# Altium footprint library Gate Driver Board.PcbLib: 123 footprints (part 8 of 8)
Each footprint in its own frame and in the unit in brackets; x right, y up, seen from the top. Pads: shape width x height; smd on the part's side, far side on the other; paste and mask are expansions set on the pad; w line width, h text height; cw(c..) or ccw(c..) is an arc to the next point about the centre after c.
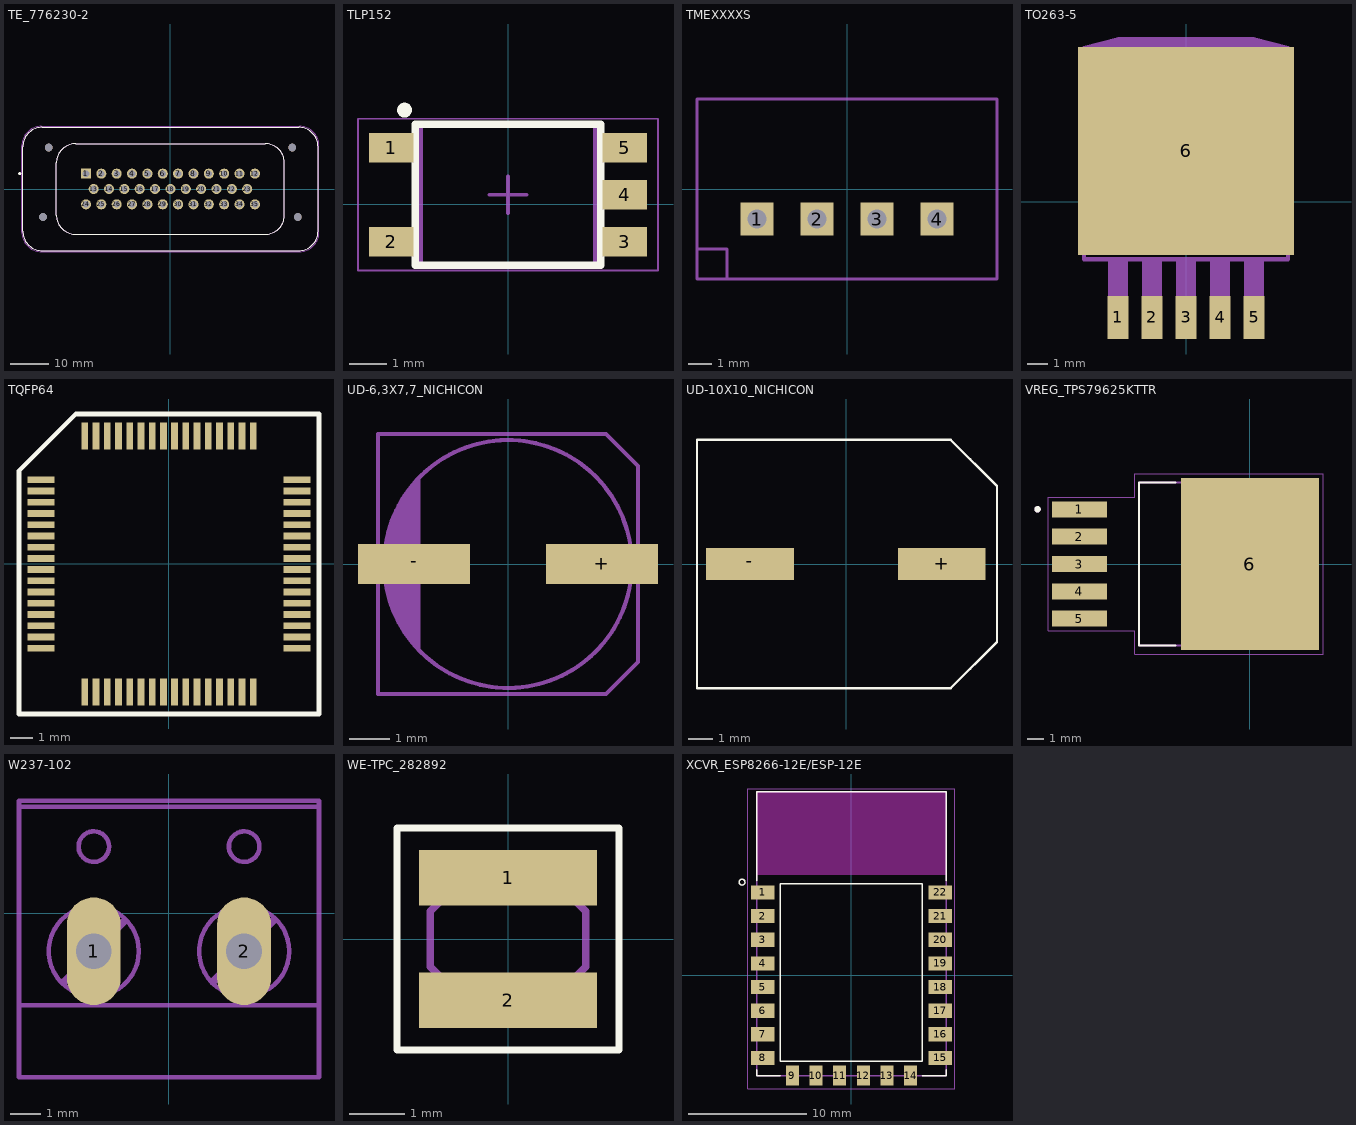
[diagram p7: the footprints below, top view; thin cyan lines are the x and y axes]

## TE_776230-2 [mm]
pads (39):
  rect 2.625x2.625 hole 1.75: 1(-22,4)
  round 2.625 hole 1.75: 2(-18,4) 3(-14,4) 4(-10,4) 5(-6,4) 6(-2,4) 7(2,4) 8(6,4) 9(10,4) 10(14,4) 11(18,4) 12(22,4) 13(-20,0) 14(-16,0) 15(-12,0) 16(-8,0) 17(-4,0) 18(0,0) 19(4,0) 20(8,0) 21(12,0) 22(16,0) 23(20,0) 24(-22,-4) 25(-18,-4) 26(-14,-4) 27(-10,-4) 28(-6,-4) 29(-2,-4) 30(2,-4) 31(6,-4) 32(10,-4) 33(14,-4) 34(18,-4) 35(22,-4)
  round 2 hole 2 unplated: ""(-33.2,-7.3) ""(-31.7,10.8) ""(31.7,10.8) ""(33.2,-7.3)
Top Overlay:
  circle w0.4: c-39.25,4 r0.2
  lines w0.127: -38.45,-11.05 ccw(c-33.45,-11.05) -33.45,-16.05 33.45,-16.05 ccw(c33.45,-11.05) 38.45,-11.05 38.45,11.05 ccw(c33.45,11.05) 33.45,16.05 -33.45,16.05 ccw(c-33.45,11.05) -38.45,11.05 -38.45,-11.05 ; -29.7,-6.8 ccw(c-24.7,-6.8) -24.7,-11.8 24.7,-11.8 ccw(c24.7,-6.8) 29.7,-6.8 29.7,6.8 ccw(c24.7,6.8) 24.7,11.8 -24.7,11.8 ccw(c-24.7,6.8) -29.7,6.8 -29.7,-6.8
Mechanical 13:
  circle w0.4: c-22,4 r0.2
  lines w0.127: -38.45,-11.05 ccw(c-33.45,-11.05) -33.45,-16.05 33.45,-16.05 ccw(c33.45,-11.05) 38.45,-11.05 38.45,11.05 ccw(c33.45,11.05) 33.45,16.05 -33.45,16.05 ccw(c-33.45,11.05) -38.45,11.05 -38.45,-11.05 ; -29.7,-6.8 ccw(c-24.7,-6.8) -24.7,-11.8 24.7,-11.8 ccw(c24.7,-6.8) 29.7,-6.8 29.7,6.8 ccw(c24.7,6.8) 24.7,11.8 -24.7,11.8 ccw(c-24.7,6.8) -29.7,6.8 -29.7,-6.8
Mechanical 15:
  lines w0.05: -38.7,-11.3 ccw(c-33.7,-11.3) -33.7,-16.3 33.7,-16.3 ccw(c33.7,-11.3) 38.7,-11.3 38.7,11.3 ccw(c33.7,11.3) 33.7,16.3 -33.7,16.3 ccw(c-33.7,11.3) -38.7,11.3 -38.7,-11.3
3D body "776230-2--3DModel-STEP-1.STEP": height 30.48, standoff -7.49, extent -38.434,-15.964 38.466,16.136

## TLP152 [mm] "SOTFL, 5-Leads, Body 3.75x7.20mm, Pitch 1.27mm, IPC Medium Density"
height 2.2
pads (5):
  rect 1.2x0.8 smd: 1(-3.15,1.524) 2(-3.15,-1.016) 3(3.15,-1.016) 4(3.15,0.254) 5(3.15,1.524)
Top Overlay:
  lines w0.2: -2.5,-1.646 2.5,-1.646 2.5,2.154 -2.5,2.154 -2.5,-1.646
  lines w0.25: -2.72,2.538 cw(c-2.794,2.54) -2.72,2.547
Assembly Top:
  lines w0.1: -2.35,-1.646 -2.35,2.154 2.35,2.154 2.35,-1.646 -2.35,-1.646
Courtyard Top:
  lines w0.05: -4.05,-1.796 -4.05,2.304 4.05,2.304 4.05,-1.796 -4.05,-1.796
  lines w0.1: -0.5,0.254 0.5,0.254 ; 0,-0.246 0,0.754
3D body "User Library-TLP-152-1.STEP": height 2.11, standoff 0.01, extent -3.393,-1.651 3.383,2.149

## TMEXXXXS [mil] "TMEXXXXS"
pads (4):
  rect 55x55 / inner round 0 / far side rect 55x55 hole 32: 1(-150,-50) 2(-50,-50) 3(50,-50) 4(150,-50)
3D Body Bottom:
  lines w5: -250,-100 -250,-150 -200,-150 ; -250,-100 -250,150 250,150 250,-150 -200,-150 ; -250,-100 -200,-100 -200,-150
  text "E-" at -200,0 h77.5
  text "E+" at -100,0 h77.5
  text "A-" at 0,0 h77.5
  text "A+" at 100,0 h77.5
3D body: height 50, standoff 0, extent -175.9,-75.9 -124.1,-24.1
3D body: height 50, standoff 0, extent -75.9,-75.9 -24.1,-24.1
3D body: height 50, standoff 0, extent 24.1,-75.9 75.9,-24.1
3D body: height 50, standoff 0, extent 124.1,-75.9 175.9,-24.1

## TO263-5 [mil] "TO263-5"
pads (6):
  rect 42x85 smd: 1(-134,-228) 2(-67,-228) 3(0,-228) 4(67,-228) 5(134,-228)
  rect 425.2x409.84 smd: 6(0,100)
Assembly Bottom:
  region: -153,-260 -153,-175 -115,-175 -115,-260
  region: -86,-260 -86,-175 -48,-175 -48,-260
  region: -19,-260 -19,-175 19,-175 19,-260
  region: 48,-260 48,-175 86,-175 86,-260
  region: 115,-260 115,-175 153,-175 153,-260
  region: -201,286.1 -201,302.29 -133,320.29 133,320.29 201,302.29 201,286.1
  lines w8: -200.55,-113.39 -200.55,282.09 200.55,282.09 200.55,-113.39 ; -200.98,286.1 -200.98,302.28 -132.99,320.28 132.99,320.28 200.98,302.28 200.98,286.1 -200.98,286.1
3D Body Bottom:
  region: -153,-176 -153,-110 -115,-110 -115,-176
  region: -86,-176 -86,-110 -48,-110 -48,-176
  region: -19,-176 -19,-110 19,-110 19,-176
  region: 48,-176 48,-110 86,-110 86,-176
  region: 115,-176 115,-110 153,-110 153,-176
  lines w8: -200.55,-113.39 200.55,-113.39

## TQFP64 [mm] "TQFP64"
pads (64):
  rect 1.2x0.3 smd: 1(-5.7,3.75) 2(-5.7,3.25) 3(-5.7,2.75) 4(-5.7,2.25) 5(-5.7,1.75) 6(-5.7,1.25) 7(-5.7,0.75) 8(-5.7,0.25) 9(-5.7,-0.25) 10(-5.7,-0.75) 11(-5.7,-1.25) 12(-5.7,-1.75) 13(-5.7,-2.25) 14(-5.7,-2.75) 15(-5.7,-3.25) 16(-5.7,-3.75) 33(5.7,-3.75) 34(5.7,-3.25) 35(5.7,-2.75) 36(5.7,-2.25) 37(5.7,-1.75) 38(5.7,-1.25) 39(5.7,-0.75) 40(5.7,-0.25) 41(5.7,0.25) 42(5.7,0.75) 43(5.7,1.25) 44(5.7,1.75) 45(5.7,2.25) 46(5.7,2.75) 47(5.7,3.25) 48(5.7,3.75)
  rect 0.3x1.2 smd: 17(-3.75,-5.7) 18(-3.25,-5.7) 19(-2.75,-5.7) 20(-2.25,-5.7) 21(-1.75,-5.7) 22(-1.25,-5.7) 23(-0.75,-5.7) 24(-0.25,-5.7) 25(0.25,-5.7) 26(0.75,-5.7) 27(1.25,-5.7) 28(1.75,-5.7) 29(2.25,-5.7) 30(2.75,-5.7) 31(3.25,-5.7) 32(3.75,-5.7) 49(3.75,5.7) 50(3.25,5.7) 51(2.75,5.7) 52(2.25,5.7) 53(1.75,5.7) 54(1.25,5.7) 55(0.75,5.7) 56(0.25,5.7) 57(-0.25,5.7) 58(-0.75,5.7) 59(-1.25,5.7) 60(-1.75,5.7) 61(-2.25,5.7) 62(-2.75,5.7) 63(-3.25,5.7) 64(-3.75,5.7)
Top Overlay:
  lines w0.203: -6.675,-6.675 -6.675,4.15 -4.15,6.675 6.675,6.675 6.675,-6.675 -6.675,-6.675

## UD-6,3X7,7_NICHICON [mm] "UD-6,3X7,7_NICHICON"
pads (2):
  rect 2.8x1 smd: +(2.35,0) -(-2.35,0)
Assembly Bottom:
  circle w0.102: c0,0 r3.1
  region: -2.2,2.15 -2.339,2.008 -2.577,1.69 -2.773,1.345 -2.923,0.977 -3.024,0.593 -3.075,0.199 -3.075,-0.199 -3.024,-0.593 -2.923,-0.977 -2.773,-1.345 -2.577,-1.69 -2.339,-2.008 -2.2,-2.15
  lines w0.102: -3.25,-3.25 2.45,-3.25 3.25,-2.45 3.25,2.45 2.45,3.25 -3.25,3.25 -3.25,-3.25
3D Body Bottom:
  lines w0.102: -3.25,-0.7 -3.25,-3.25 2.45,-3.25 3.25,-2.45 ; -3.25,0.8 -3.25,3.25 2.45,3.25 3.25,2.45 ; -3,0.775 cw(c-0.002,0.005) 2.975,0.85 ; -2.975,-0.85 ccw(c0.002,-0.005) 3,-0.775

## UD-10X10_NICHICON [mm] "UD-10X10_NICHICON"
pads (2):
  rect 3.6x1.3 smd: +(3.925,0) -(-3.95,0)
Top Overlay:
  lines w0.102: -5.1,-5.1 4.3,-5.1 ; -5.1,5.1 4.3,5.1 ; 5.1,-4.3 4.3,-5.1 ; 5.1,4.3 4.3,5.1 ; 4.3,-5.1 6.2,-3.2 6.2,3.2 4.3,5.1 ; 4.3,-5.1 -6.125,-5.1 -6.125,5.1 4.3,5.1

## VREG_TPS79625KTTR [mm]
pads (6):
  rect 3.4x1 smd paste-3 mask+0: 1(-10.6,3.4) 2(-10.6,1.7) 3(-10.6,0) 4(-10.6,-1.7) 5(-10.6,-3.4)
  rect 8.6x10.7 smd paste-6 mask+0: 6(0,0)
Top Overlay:
  circle w0.2: c-13.2,3.4 r0.1
  lines w0.127: -4.62,-5.08 -6.905,-5.08 -6.905,5.08 -4.62,5.08
Top Paste:
  region: -8.95,-3.85 -12.25,-3.85 -12.25,-2.95 -8.95,-2.95
  region: -8.95,-2.15 -12.25,-2.15 -12.25,-1.25 -8.95,-1.25
  region: -8.95,2.95 -12.25,2.95 -12.25,3.85 -8.95,3.85
  region: -8.95,1.25 -12.25,1.25 -12.25,2.15 -8.95,2.15
  region: -8.95,-0.45 -12.25,-0.45 -12.25,0.45 -8.95,0.45
  region: 4.25,-5.3 -4.25,-5.3 -4.25,5.3 4.25,5.3
Top Solder:
  region: -8.83,-3.97 -12.37,-3.97 -12.37,-2.83 -8.83,-2.83
  region: -8.83,-2.27 -12.37,-2.27 -12.37,-1.13 -8.83,-1.13
  region: -8.83,2.83 -12.37,2.83 -12.37,3.97 -8.83,3.97
  region: -8.83,1.13 -12.37,1.13 -12.37,2.27 -8.83,2.27
  region: -8.83,-0.57 -12.37,-0.57 -12.37,0.57 -8.83,0.57
  region: 4.37,-5.42 -4.37,-5.42 -4.37,5.42 4.37,5.42
Mechanical 13:
  circle w0.2: c-13.2,3.4 r0.1
  lines w0.127: -6.905,-5.08 2.02,-5.08 2.02,5.08 -6.905,5.08 -6.905,-5.08
Mechanical 15:
  lines w0.05: -12.55,-4.15 -12.55,4.15 -7.155,4.15 -7.155,5.6 4.55,5.6 4.55,-5.6 -7.155,-5.6 -7.155,-4.15 -12.55,-4.15
3D body "NOPB.STEP": height 4.78, standoff -0.03, extent -11.525,-5.103 2.826,5.057

## W237-102 [mil] "W237-102"
pads (2):
  oval 70.5x141 / inner round 0 / far side oval 70.5x141 hole 47: 1(-98.43,-50) 2(98.43,-50)
Assembly Bottom:
  circle w6: c98.57,-50 r59
  circle w6: c-98.43,-50 r59
  lines w6: -133.43,-120.98 -63.43,-120.98 ; 63.58,-120.98 133.58,-120.98
  lines w10: -137.44,-90 -58.43,-10.98 ; 58.58,-89.02 136.57,-10
3D Body Bottom:
  circle w6: c98.57,87 r20
  circle w6: c-98.43,87 r20
  lines w6: -133.43,-120.98 -196.42,-120.98 ; -63.43,-120.98 63.58,-120.98 ; 133.58,-120.98 196.57,-120.98 ; -196.42,-120.98 -196.42,139.02 ; -196.42,-120.98 -196.42,-215 196.57,-215 196.57,-120.98 ; -196.42,139.02 -196.42,147.01 196.57,147.01 196.57,139.02 ; -196.42,139.02 196.57,139.02 ; 196.57,-120.98 196.57,139.02
  text "2" at 16.57,25 h77.5
  text "1" at -178.43,25 h77.5
3D body: height 50, standoff 0, extent 62.88,-120.8 133.98,20.8
3D body: height 50, standoff 0, extent -133.98,-120.8 -62.88,20.8
3D body: height 150, standoff 0, extent 36.27,-112.3 160.87,12.3
3D body: height 150, standoff 0, extent -160.73,-112.3 -36.13,12.3
3D body: height 150, standoff 0, extent 60.33,-124.23 136.83,-117.73
3D body: height 150, standoff 0, extent -136.68,-124.23 -60.18,-117.73
3D body: height 150, standoff 0, extent 53.17,-94.43 141.98,-4.59
3D body: height 150, standoff 0, extent -142.85,-95.41 -53.02,-5.57

## WE-TPC_282892 [mm]
pads (2):
  rect 3.2x1 smd: 1(0,1.1) 2(0,-1.1)
Top Overlay:
  lines w0.127: -2,-2 2,-2 2,2 -2,2 -2,-2
Mechanical 13:
  lines w0.127: -1.4,-0.5 -1.4,0.5 -0.5,1.4 0.5,1.4 1.4,0.5 1.4,-0.5 0.5,-1.4 -0.5,-1.4 -1.4,-0.5
3D body "User Library-SDR0302.STEP": height 3, standoff 0, extent -1.575,-1.5 1.409,1.5

## XCVR_ESP8266-12E/ESP-12E [mm]
pads (22):
  rect 2x1.2 smd: 1(-7.5,7) 2(-7.5,5) 3(-7.5,3) 4(-7.5,1) 5(-7.5,-1) 6(-7.5,-3) 7(-7.5,-5) 8(-7.5,-7) 15(7.5,-7) 16(7.5,-5) 17(7.5,-3) 18(7.5,-1) 19(7.5,1) 20(7.5,3) 21(7.5,5) 22(7.5,7)
  rect 1.1x1.7 smd: 9(-5,-8.5) 10(-3,-8.5) 11(-1,-8.5) 12(1,-8.5) 13(3,-8.5) 14(5,-8.5)
Top Overlay:
  circle w0.127: c-9.25,7.875 r0.25
  lines w0.127: -8,-8 -8,-8.5 -6,-8.5 ; -8,8 -8,15.5 8,15.5 8,8 ; 6,-8.5 8,-8.5 8,-8 ; -6,-7.26 -6,7.74 6,7.74 6,-7.26 -6,-7.26
Keep-Out Layer:
  region: 8,8.51 -8.009,8.51 -8.009,15.5 8,15.5
  region: 8,8.51 -8.009,8.51 -8.009,15.5 8,15.5
Mechanical 13:
  lines w0.127: -8,-8.5 -8,15.5 8,15.5 8,-8.5 -8,-8.5
Mechanical 15:
  lines w0.05: -8.75,-9.625 -8.75,15.75 8.75,15.75 8.75,-9.625 -8.75,-9.625
3D body "ESP8266-12E-ESP-12E--3DModel-STEP-1.STEP": height 3.01, standoff 0.01, extent -7.95,-8.55 8.05,15.45